# Altium footprint library PcbLib_jp.PcbLib: 178 footprints (part 11 of 12)
Each footprint in its own frame and in the unit in brackets; x right, y up, seen from the top. Pads: shape width x height; smd on the part's side, far side on the other; paste and mask are expansions set on the pad; w line width, h text height; cw(c..) or ccw(c..) is an arc to the next point about the centre after c.
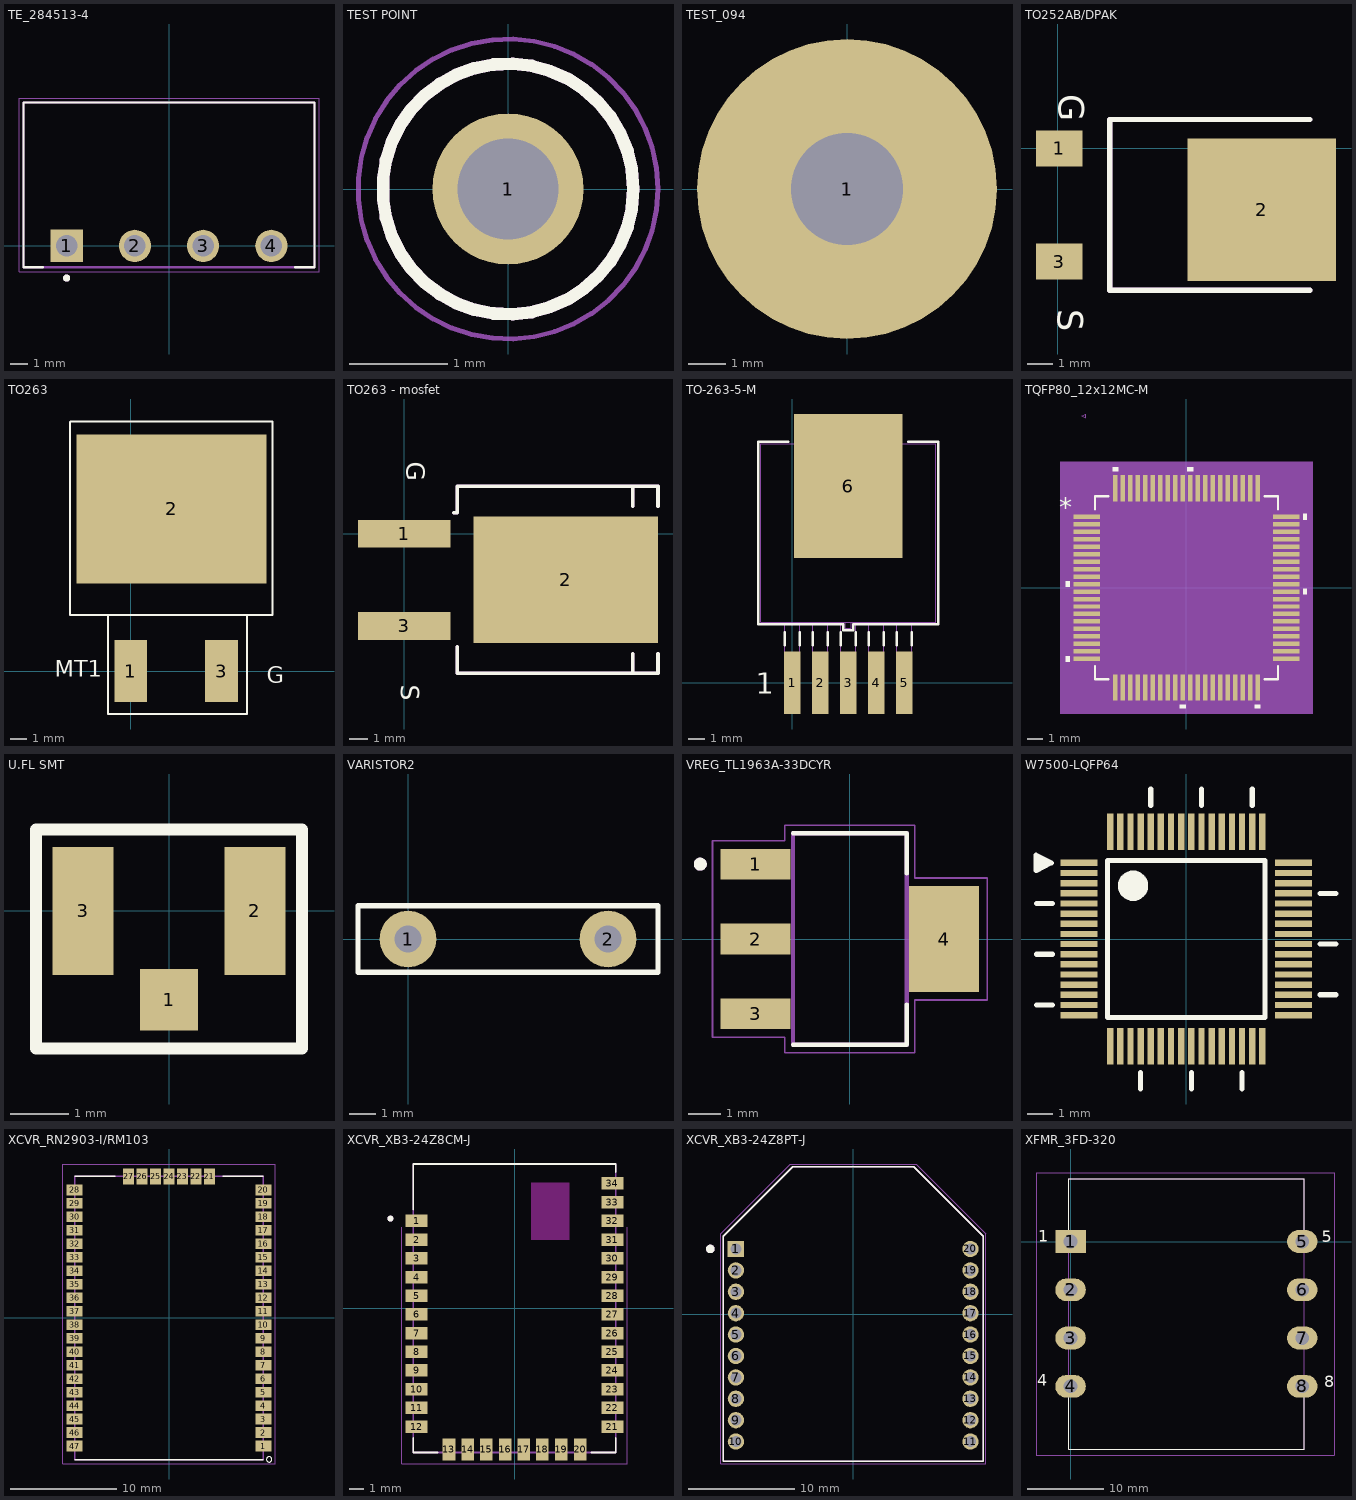
[diagram p10: the footprints below, top view; thin cyan lines are the x and y axes]

## TE_284513-4 [mm]
pads (4):
  rect 1.8x1.8 hole 1.2: 1(-5.715,0)
  round 1.8 hole 1.2: 2(-1.905,0) 3(1.905,0) 4(5.715,0)
Top Overlay:
  circle w0.2: c-5.715,-1.8 r0.1
  lines w0.127: -7.035,-1.2 -8.125,-1.2 -8.125,8 8.125,8 8.125,-1.2 7.035,-1.2
Mechanical 13:
  circle w0.2: c-5.715,-1.8 r0.1
  lines w0.127: -8.125,-1.2 8.125,-1.2 8.125,8 -8.125,8 -8.125,-1.2
Mechanical 15:
  lines w0.05: -8.375,-1.45 -8.375,8.25 8.375,8.25 8.375,-1.45 -8.375,-1.45
3D body "284513-4.stp": height 7.3, standoff -3.4, extent -8.7,-1.3 8.83,7.9

## TEST POINT [mm]
pads (1):
  round 1.53 hole 1.02: 1(0,0)
Top Overlay:
  circle w0.127: c0,0 r1.27
Mechanical 13:
  circle w0.127: c0,0 r1.27
  circle w0.127: c0,0 r1.27
Mechanical 16:
  circle w0.05: c0,0 r1.52
3D body "User Library-Test Point Keystone - 5000 RED.STEP": height 4.57, standoff -3.05, extent -1.27,-1.27 1.27,1.27

## TEST_094 [mm]
pads (1):
  round 8 hole 3: 1(0,0)
Top Overlay:
  circle w0.127: c0,0 r1.27
Mechanical 13:
  circle w0.127: c0,0 r1.27
  circle w0.127: c0,0 r1.27
Mechanical 16:
  circle w0.05: c0,0 r1.52

## TO252AB/DPAK [mil]
pads (3):
  rect 72x56 smd: 1(2,0) 3(2,-175)
  rect 230x220 smd: 2(315,-95)
Top Overlay:
  lines w8: 390,-219.5 80,-219.5 80,44.5 390,44.5
  text "S" at 0,-249 h39.37
  text "G" at 1,84 h39.37
Mechanical 1:
  lines w8: 390,-219.5 80,-219.5 80,44.5 390,44.5
3D body "User Library-DPAK-1.STEP": height 84.35, standoff -10.73, extent -13.77,-216.74 377.5,40.74

## TO263 [mm]
pads (3):
  rect 2.03x3.81 smd: 1(0,0) 3(5.6,0)
  rect 11.68x9.17 smd: 2(2.515,9.982)
Top Overlay:
  lines w0.125: 7.163,3.302 7.163,3.429
  lines w0.127: -3.734,15.342 -3.734,3.454 8.738,3.454 8.738,15.367 -3.708,15.367 ; -1.397,3.048 -1.397,3.277 ; -1.397,3.378 -1.397,3.277 ; 7.163,3.302 7.163,-2.642 -1.397,-2.642 -1.397,3.277
  text "MT1" at -4.674,-0.356 h1
  text "G" at 8.382,-0.737 h1
Top Paste:
  region: 1.06,10.74 2.29,10.74 2.29,9.48 1.06,9.48
  region: 1.06,12.53 2.29,12.53 2.29,11.27 1.06,11.27
  region: 1.06,14.32 2.29,14.32 2.29,13.06 1.06,13.06
  region: 1.06,8.95 2.29,8.95 2.29,7.69 1.06,7.69
  region: 1.06,7.16 2.29,7.16 2.29,5.9 1.06,5.9
  region: 2.79,10.74 4.02,10.74 4.02,9.48 2.79,9.48
  region: 2.79,12.53 4.02,12.53 4.02,11.27 2.79,11.27
  region: 2.79,14.32 4.02,14.32 4.02,13.06 2.79,13.06
  region: 2.79,8.95 4.02,8.95 4.02,7.69 2.79,7.69
  region: 2.79,7.16 4.02,7.16 4.02,5.9 2.79,5.9
  region: 4.52,10.74 5.75,10.74 5.75,9.48 4.52,9.48
  region: 4.52,12.53 5.75,12.53 5.75,11.27 4.52,11.27
  region: 4.52,14.32 5.75,14.32 5.75,13.06 4.52,13.06
  region: 4.52,8.95 5.75,8.95 5.75,7.69 4.52,7.69
  region: 4.52,7.16 5.75,7.16 5.75,5.9 4.52,5.9
  region: 6.25,10.74 7.48,10.74 7.48,9.48 6.25,9.48
  region: 6.25,12.53 7.48,12.53 7.48,11.27 6.25,11.27
  region: 6.25,14.32 7.48,14.32 7.48,13.06 6.25,13.06
  region: 6.25,8.95 7.48,8.95 7.48,7.69 6.25,7.69
  region: 6.25,7.16 7.48,7.16 7.48,5.9 6.25,5.9
  region: -2.4,10.74 -1.17,10.74 -1.17,9.48 -2.4,9.48
  region: -2.4,12.53 -1.17,12.53 -1.17,11.27 -2.4,11.27
  region: -2.4,14.32 -1.17,14.32 -1.17,13.06 -2.4,13.06
  region: -2.4,8.95 -1.17,8.95 -1.17,7.69 -2.4,7.69
  region: -2.4,7.16 -1.17,7.16 -1.17,5.9 -2.4,5.9
  region: -0.67,10.74 0.56,10.74 0.56,9.48 -0.67,9.48
  region: -0.67,12.53 0.56,12.53 0.56,11.27 -0.67,11.27
  region: -0.67,14.32 0.56,14.32 0.56,13.06 -0.67,13.06
  region: -0.67,8.95 0.56,8.95 0.56,7.69 -0.67,7.69
  region: -0.67,7.16 0.56,7.16 0.56,5.9 -0.67,5.9
Mechanical 16:
  lines w0.05: -3.708,3.51 -1.397,3.51 -1.397,-2.642 7.163,-2.642 7.163,3.51 8.738,3.51 8.738,15.367 -3.708,15.367 -3.708,3.51
3D body: height 18.95, standoff 3.95, extent 7.239,1.422 7.239,1.422
3D body: height 18.95, standoff 3.95, extent 2.134,3.124 2.134,3.124
3D body: height 18.95, standoff 3.95, extent 1.575,4.242 1.575,4.242
3D body "User Library-TO263-3.STEP": height 3.18, standoff -1.62, extent -2.202,-2.222 7.798,13.448

## TO263 - mosfet [mil]
pads (3):
  rect 200x60 smd: 1(0,0) 3(0,-200)
  rect 400x275 smd: 2(350,-100)
Top Overlay:
  lines w8: 107.5,45 115,45 115,102.5 550,102.5 550,60 ; 115,-245 115,-302.5 550,-302.5 550,-260 ; 495,-302.5 495,-260 ; 495,60 495,102.5
  text "S" at -6,-327 h39.37
  text "G" at 6,156 h39.37
Mechanical 1:
  lines w8: 107.5,45 115,45 115,102.5 550,102.5 550,60 ; 115,-245 115,-302.5 550,-302.5 550,-260 ; 495,-302.5 495,-260 ; 495,60 495,102.5
3D body "User Library-DPAK.STEP": height 212.01, standoff 14.45, extent -65.71,-297 535.22,103

## TO-263-5-M [mil]
pads (6):
  rect 40x150 smd paste+0 mask+0: 1(0,0) 2(67,0) 3(134,0) 4(201,0) 5(268,0)
  rect 260x345 smd paste+0 mask+0: 6(134,470.5)
Top Overlay:
  lines w6: -18,89 -18,121 ; -9.1,577 -81,577 -81,140 121.5,140 121.5,125 146.5,125 146.5,140 349,140 349,577 277.1,577 ; 18,89 18,121 ; 49,89 49,121 ; 85,89 85,121 ; 116,89 116,121 ; 152,89 152,121 ; 183,89 183,121 ; 219,89 219,121 ; 250,89 250,121 ; 286,89 286,121
  text "1" at -87,-27 h50
Mechanical 13:
  lines w1: -76,145 344,145 344,572 -76,572 -76,145 ; -18,-53 -18,145 18,145 18,-53 -18,-53 ; 49,-53 49,145 85,145 85,-53 49,-53 ; 116,-53 116,145 152,145 152,-53 116,-53 ; 126.5,130 126.5,145 141.5,145 141.5,130 126.5,130 ; 183,-53 183,145 219,145 219,-53 183,-53 ; 250,-53 250,145 286,145 286,-53 250,-53
  text "*" at -12.5,130 h50
3D body: height 10, standoff 0, extent 134,358.5 144,368.5
3D body "User Library-TO263-5.STEP": height 204.04, standoff 15.07, extent -60.7,-9.47 333,607.47

## TQFP80_12x12MC-M [mm]
pads (80):
  rect 1.762x0.299 smd paste+0 mask+0: 1(-6.667,4.75) 2(-6.667,4.25) 3(-6.667,3.75) 4(-6.667,3.25) 5(-6.667,2.75) 6(-6.667,2.25) 7(-6.667,1.75) 8(-6.667,1.25) 9(-6.667,0.75) 10(-6.667,0.25) 11(-6.667,-0.25) 12(-6.667,-0.75) 13(-6.667,-1.25) 14(-6.667,-1.75) 15(-6.667,-2.25) 16(-6.667,-2.75) 17(-6.667,-3.25) 18(-6.667,-3.75) 19(-6.667,-4.25) 20(-6.667,-4.75) 41(6.667,-4.75) 42(6.667,-4.25) 43(6.667,-3.75) 44(6.667,-3.25) 45(6.667,-2.75) 46(6.667,-2.25) 47(6.667,-1.75) 48(6.667,-1.25) 49(6.667,-0.75) 50(6.667,-0.25) 51(6.667,0.25) 52(6.667,0.75) 53(6.667,1.25) 54(6.667,1.75) 55(6.667,2.25) 56(6.667,2.75) 57(6.667,3.25) 58(6.667,3.75) 59(6.667,4.25) 60(6.667,4.75)
  rect 0.299x1.762 smd paste+0 mask+0: 21(-4.75,-6.667) 22(-4.25,-6.667) 23(-3.75,-6.667) 24(-3.25,-6.667) 25(-2.75,-6.667) 26(-2.25,-6.667) 27(-1.75,-6.667) 28(-1.25,-6.667) 29(-0.75,-6.667) 30(-0.25,-6.667) 31(0.25,-6.667) 32(0.75,-6.667) 33(1.25,-6.667) 34(1.75,-6.667) 35(2.25,-6.667) 36(2.75,-6.667) 37(3.25,-6.667) 38(3.75,-6.667) 39(4.25,-6.667) 40(4.75,-6.667) 61(4.75,6.667) 62(4.25,6.667) 63(3.75,6.667) 64(3.25,6.667) 65(2.75,6.667) 66(2.25,6.667) 67(1.75,6.667) 68(1.25,6.667) 69(0.75,6.667) 70(0.25,6.667) 71(-0.25,6.667) 72(-0.75,6.667) 73(-1.25,6.667) 74(-1.75,6.667) 75(-2.25,6.667) 76(-2.75,6.667) 77(-3.25,6.667) 78(-3.75,6.667) 79(-4.25,6.667) 80(-4.75,6.667)
Top Overlay:
  region: -7.802,0.44 -8.056,0.44 -8.056,0.059 -7.802,0.059
  region: -7.802,-4.56 -8.056,-4.56 -8.056,-4.941 -7.802,-4.941
  region: -0.059,-7.802 -0.44,-7.802 -0.44,-8.056 -0.059,-8.056
  region: 4.941,-7.802 4.56,-7.802 4.56,-8.056 4.941,-8.056
  region: 7.802,-0.059 8.056,-0.059 8.056,-0.44 7.802,-0.44
  region: 7.802,4.941 8.056,4.941 8.056,4.56 7.802,4.56
  region: 0.44,7.802 0.059,7.802 0.059,8.056 0.44,8.056
  region: -4.56,7.802 -4.941,7.802 -4.941,8.056 -4.56,8.056
  lines w0.152: -6.121,-5.232 -6.121,-6.121 -5.232,-6.121 ; -6.121,5.232 -6.121,6.121 -5.232,6.121 ; 5.232,-6.121 6.121,-6.121 6.121,-5.232 ; 5.232,6.121 6.121,6.121 6.121,5.232
  text "*" at -8.5,4.746 h1.27
Mechanical 5:
  region: 8.437,-8.437 -8.437,-8.437 -8.437,8.437 8.437,8.437
Mechanical 7:
  lines w0.025: -6.998,11.493 -6.744,11.62 -6.744,11.366 -6.998,11.493
Mechanical 13:
  drawing of 325 lines, arcs and shapes, not listed
  text "*" at -5.931,4.365 h1.27
Mechanical 15:
  region: -5.408,-6.502 -6.502,-6.502 -6.502,-5.408 -8.056,-5.408 -8.056,5.408 -6.502,5.408 -6.502,6.502 -5.408,6.502 -5.408,8.056 5.408,8.056 5.408,6.502 6.502,6.502 6.502,5.408 8.056,5.408 8.056,-5.408 6.502,-5.408 6.502,-6.502 5.408,-6.502 5.408,-8.056 -5.408,-8.056
  lines w0.152: -8.056,-5.408 -6.502,-5.408 -6.502,-6.502 -5.408,-6.502 -5.408,-8.056 5.408,-8.056 5.408,-6.502 6.502,-6.502 6.502,-5.408 8.056,-5.408 8.056,5.408 6.502,5.408 6.502,6.502 5.408,6.502 5.408,8.056 -5.408,8.056 -5.408,6.502 -6.502,6.502 -6.502,5.408 -8.056,5.408 -8.056,-5.408
3D body: height 0.25, standoff 0, extent 0,0 0.254,0.254
3D body "TQFP80_12x12MC-M.step": height 1.2, standoff 0, extent -6.972,-7.049 7.024,6.947

## U.FL SMT [mm]
height 0.71
pads (3):
  rect 1x1.05 smd: 1(0,-1.525)
  rect 1.05x2.2 smd: 2(1.475,0) 3(-1.475,0)
Top Overlay:
  lines w0.203: -2.286,-2.362 -2.286,1.397 2.286,1.397 2.286,-2.362 -2.286,-2.362
3D body "U.FL-R-SMT(10)--3DModel-STEP-56544.STEP": height 1.45, standoff 0.2, extent -1.53,-1.62 1.57,1.38

## VARISTOR2 [mil]
pads (2):
  round 85 / inner round 60 / far side round 85 hole 40: 1(0,0) 2(300,0)
Top Overlay:
  lines w8: -75,-50 -75,50 -50,50 375,50 375,-50 -75,-50
3D body: height 745.96, standoff 155.41, extent 859,-210 859,-210
3D body: height 745.96, standoff 155.41, extent 194,141 194,141
3D body: height 745.96, standoff 155.41, extent 194,141 194,141
3D body "45942.stp": height 757.87, standoff -875.98, extent -174.68,-155.6 474.69,95.12

## VREG_TL1963A-33DCYR [mm]
pads (4):
  rect 2.15x0.95 smd: 1(-2.9,2.3) 2(-2.9,0) 3(-2.9,-2.3)
  rect 2.15x3.25 smd: 4(2.9,0)
Top Overlay:
  circle w0.2: c-4.6,2.3 r0.1
  lines w0.127: -1.75,-3.25 1.75,-3.25 1.75,-2.01 ; -1.75,3.25 1.75,3.25 1.75,2.01
Mechanical 13:
  circle w0.2: c-4.6,2.3 r0.1
  lines w0.127: -1.75,-3.25 1.75,-3.25 1.75,3.25 -1.75,3.25 -1.75,-3.25
Mechanical 15:
  lines w0.05: -4.225,-3.025 -2,-3.025 -2,-3.5 2,-3.5 2,-1.875 4.225,-1.875 4.225,1.875 2,1.875 2,3.5 -2,3.5 -2,3.025 -4.225,3.025 -4.225,-3.025
3D body "TL1963A-33DCYR.step": height 1.8, standoff 0, extent -3.439,-3.28 3.559,3.22

## W7500-LQFP64 [mm] "WIZnet ARM Cortex-M0, LQFP64, Pitch 0.40mm"
height 1.2
pads (64):
  rect 1.45x0.25 smd: 1(-4.225,3) 2(-4.225,2.6) 3(-4.225,2.2) 4(-4.225,1.8) 5(-4.225,1.4) 6(-4.225,1) 7(-4.225,0.6) 8(-4.225,0.2) 9(-4.225,-0.2) 10(-4.225,-0.6) 11(-4.225,-1) 12(-4.225,-1.4) 13(-4.225,-1.8) 14(-4.225,-2.2) 15(-4.225,-2.6) 16(-4.225,-3) 33(4.225,-3) 34(4.225,-2.6) 35(4.225,-2.2) 36(4.225,-1.8) 37(4.225,-1.4) 38(4.225,-1) 39(4.225,-0.6) 40(4.225,-0.2) 41(4.225,0.2) 42(4.225,0.6) 43(4.225,1) 44(4.225,1.4) 45(4.225,1.8) 46(4.225,2.2) 47(4.225,2.6) 48(4.225,3)
  rect 0.25x1.45 smd: 17(-3,-4.225) 18(-2.6,-4.225) 19(-2.2,-4.225) 20(-1.8,-4.225) 21(-1.4,-4.225) 22(-1,-4.225) 23(-0.6,-4.225) 24(-0.2,-4.225) 25(0.2,-4.225) 26(0.6,-4.225) 27(1,-4.225) 28(1.4,-4.225) 29(1.8,-4.225) 30(2.2,-4.225) 31(2.6,-4.225) 32(3,-4.225) 49(3,4.225) 50(2.6,4.225) 51(2.2,4.225) 52(1.8,4.225) 53(1.4,4.225) 54(1,4.225) 55(0.6,4.225) 56(0.2,4.225) 57(-0.2,4.225) 58(-0.6,4.225) 59(-1,4.225) 60(-1.4,4.225) 61(-1.8,4.225) 62(-2.2,4.225) 63(-2.6,4.225) 64(-3,4.225)
Top Overlay:
  circle w0.6: c-2.1,2.1 r0.3
  lines w0.2: -3.1,-3.1 3.1,-3.1 3.1,3.1 -3.1,3.1 -3.1,-3.1
  lines w0.203: -5.925,3.138 -5.637,3.138 ; -5.903,-2.6 -5.268,-2.6 ; -5.903,-0.6 -5.268,-0.6 ; -5.903,1.4 -5.268,1.4 ; -5.723,2.801 -5.723,2.809 -5.914,3 -5.325,3 ; -1.8,-5.903 -1.8,-5.268 ; -1.4,5.268 -1.4,5.903 ; 0.2,-5.903 0.2,-5.268 ; 0.6,5.268 0.6,5.903 ; 2.2,-5.903 2.2,-5.268 ; 2.6,5.268 2.6,5.903 ; 5.268,-2.2 5.903,-2.2 ; 5.268,-0.2 5.903,-0.2 ; 5.268,1.8 5.903,1.8 ; -5.325,3 -5.925,3.3 -5.925,2.7 -5.325,3
3D body "W7500-48PIN.step": height 1, standoff 0, extent -4.73,-4.736 4.73,4.724

## XCVR_RN2903-I/RM103 [mil]
pads (47):
  rect 60x40 smd: 1(350,-475) 2(350,-425) 3(350,-375) 4(350,-325) 5(350,-275) 6(350,-225) 7(350,-175) 8(350,-125) 9(350,-75) 10(350,-25) 11(350,25) 12(350,75) 13(350,125) 14(350,175) 15(350,225) 16(350,275) 17(350,325) 18(350,375) 19(350,425) 20(350,475) 28(-350,475) 29(-350,425) 30(-350,375) 31(-350,325) 32(-350,275) 33(-350,225) 34(-350,175) 35(-350,125) 36(-350,75) 37(-350,25) 38(-350,-25) 39(-350,-75) 40(-350,-125) 41(-350,-175) 42(-350,-225) 43(-350,-275) 44(-350,-325) 45(-350,-375) 46(-350,-425) 47(-350,-475)
  rect 40x60 smd: 21(150,525) 22(100,525) 23(50,525) 24(0,525) 25(-50,525) 26(-100,525) 27(-150,525)
Top Overlay:
  circle w0: c371.26,-524.21 r10
  lines w5: -350,-525 350,-525 ; -350,525 -200,525 ; 200,525 350,525
Mechanical 13:
  lines w5: -350,-525 350,-525 350,525 -350,525 -350,-525
Mechanical 15:
  lines w1.97: -393.7,-541.34 393.7,-541.34 393.7,570.87 -393.7,570.87 -393.7,-541.34
3D body "User Library-RN2903.STEP": height 131.5, standoff 0, extent -341.33,-527.75 358.67,522.25

## XCVR_XB3-24Z8CM-J [mil]
pads (34):
  rect 57x33 smd: 1(-258,230) 2(-258,180.8) 3(-258,131.6) 4(-258,82.4) 5(-258,33.2) 6(-258,-16) 7(-258,-65.2) 8(-258,-114.4) 9(-258,-163.6) 10(-258,-212.8) 11(-258,-262) 12(-258,-311.2) 21(258,-311.2) 22(258,-262) 23(258,-212.8) 24(258,-163.6) 25(258,-114.4) 26(258,-65.2) 27(258,-16) 28(258,33.2) 29(258,82.4) 30(258,131.6) 31(258,180.8) 32(258,230) 33(258,279.2) 34(258,329)
  rect 33x57 smd: 13(-172.5,-371.5) 14(-123.3,-371.5) 15(-74.1,-371.5) 16(-24.9,-371.5) 17(24.3,-371.5) 18(73.5,-371.5) 19(122.7,-371.5) 20(172.5,-371.5)
Top Overlay:
  circle w7.87: c-326.77,236.22 r3.94
  lines w5: -266.5,-341.73 -266.5,-380 -202.76,-380 ; -266.5,260.24 -266.5,380 266.5,380 266.5,359.45 ; 202.76,-380 266.5,-380 266.5,-341.73
Keep-Out Layer:
  region: 143.5,180 43.5,180 43.5,330 143.5,330
Mechanical 13:
  circle w7.87: c-326.77,236.22 r3.94
  lines w5: -266.5,-380 -266.5,380 266.5,380 266.5,-380 -266.5,-380
Mechanical 15:
  lines w1.97: -296.46,214 -296.46,-409.84 296.46,-409.84 296.46,214
3D body "XB3-24Z8CM-J--3DModel-STEP-56544.STEP": height 136.37, standoff 39.37, extent -262.34,-360.31 271.65,399.69

## XCVR_XB3-24Z8PT-J [mm]
pads (20):
  rect 1.53x1.53 hole 1.02: 1(-10.998,6.096)
  round 1.53 hole 1.02: 2(-10.998,4.089) 3(-10.998,2.083) 4(-10.998,0.076) 5(-10.998,-1.93) 6(-10.998,-3.937) 7(-10.998,-5.944) 8(-10.998,-7.95) 9(-10.998,-9.957) 10(-10.998,-11.963) 11(10.998,-11.963) 12(10.998,-9.957) 13(10.998,-7.95) 14(10.998,-5.944) 15(10.998,-3.937) 16(10.998,-1.93) 17(10.998,0.076) 18(10.998,2.083) 19(10.998,4.089) 20(10.998,6.096)
Top Overlay:
  circle w0.4: c-13.4,6.1 r0.2
  lines w0.127: -12.192,-13.818 -12.192,7.29 -5.664,13.818 5.664,13.818 12.192,7.29 12.192,-13.818 -12.192,-13.818
Mechanical 13:
  circle w0.4: c-13.4,6.1 r0.2
  lines w0.127: -12.192,-13.818 12.192,-13.818 12.192,7.29 5.664,13.818 -5.664,13.818 -12.192,7.29 -12.192,-13.818
Mechanical 15:
  lines w0.05: -12.442,-14.068 12.442,-14.068 12.442,7.544 5.918,14.068 -5.918,14.068 -12.442,7.544 -12.442,-14.068
3D body "XB3-24Z8PT-J--3DModel-STEP-56544.STEP": height 3.55, standoff -4.1, extent -12.192,-13.769 12.192,13.866

## XFMR_3FD-320 [mm] "TAMURA"
pads (8):
  rect 4x3 hole 1.8: 1(0,0)
  oval 4x3 hole 1.8: 2(0,-6.35) 3(0,-12.7) 4(0,-19.05) 5(30.48,0) 6(30.48,-6.35) 7(30.48,-12.7) 8(30.48,-19.05)
Top Overlay:
  lines w0.127: -0.26,-20.425 -0.26,-27.305 30.74,-27.305 30.74,-20.425 ; -0.26,1.375 -0.26,8.255 30.74,8.255 30.74,1.375
  text "1" at -4.242,-0.051 h1.52
  text "8" at 33.401,-19.152 h1.52
  text "5" at 33.045,-0.127 h1.52
  text "4" at -4.394,-18.948 h1.52
Mechanical 13:
  lines w0.127: -0.26,-27.305 30.74,-27.305 ; -0.26,-27.305 -0.26,8.255 ; -0.26,-27.305 30.74,-27.305 ; -0.26,-27.305 -0.26,8.255 ; -0.26,8.255 30.74,8.255 ; -0.26,8.255 30.74,8.255 ; 30.74,-27.305 30.74,8.255 ; 30.74,-27.305 30.74,8.255
Mechanical 16:
  lines w0.05: -4.547,-28.143 34.671,-28.143 34.671,9.068 -4.547,9.068 -4.547,-28.143
3D body: height 0.25, standoff 0, extent 15.24,-9.525 15.24,-9.525
3D body: height 0.25, standoff 0, extent 39.497,12.827 39.497,12.827
3D body "User Library-Tamura 3FD-312.step": height 32.1, standoff -4.8, extent -0.253,-27.81 30.987,8.76